# Altium schematic symbol library FPGA_Xilinx_Virtex6.SchLib: 28 symbols (part 3 of 21)
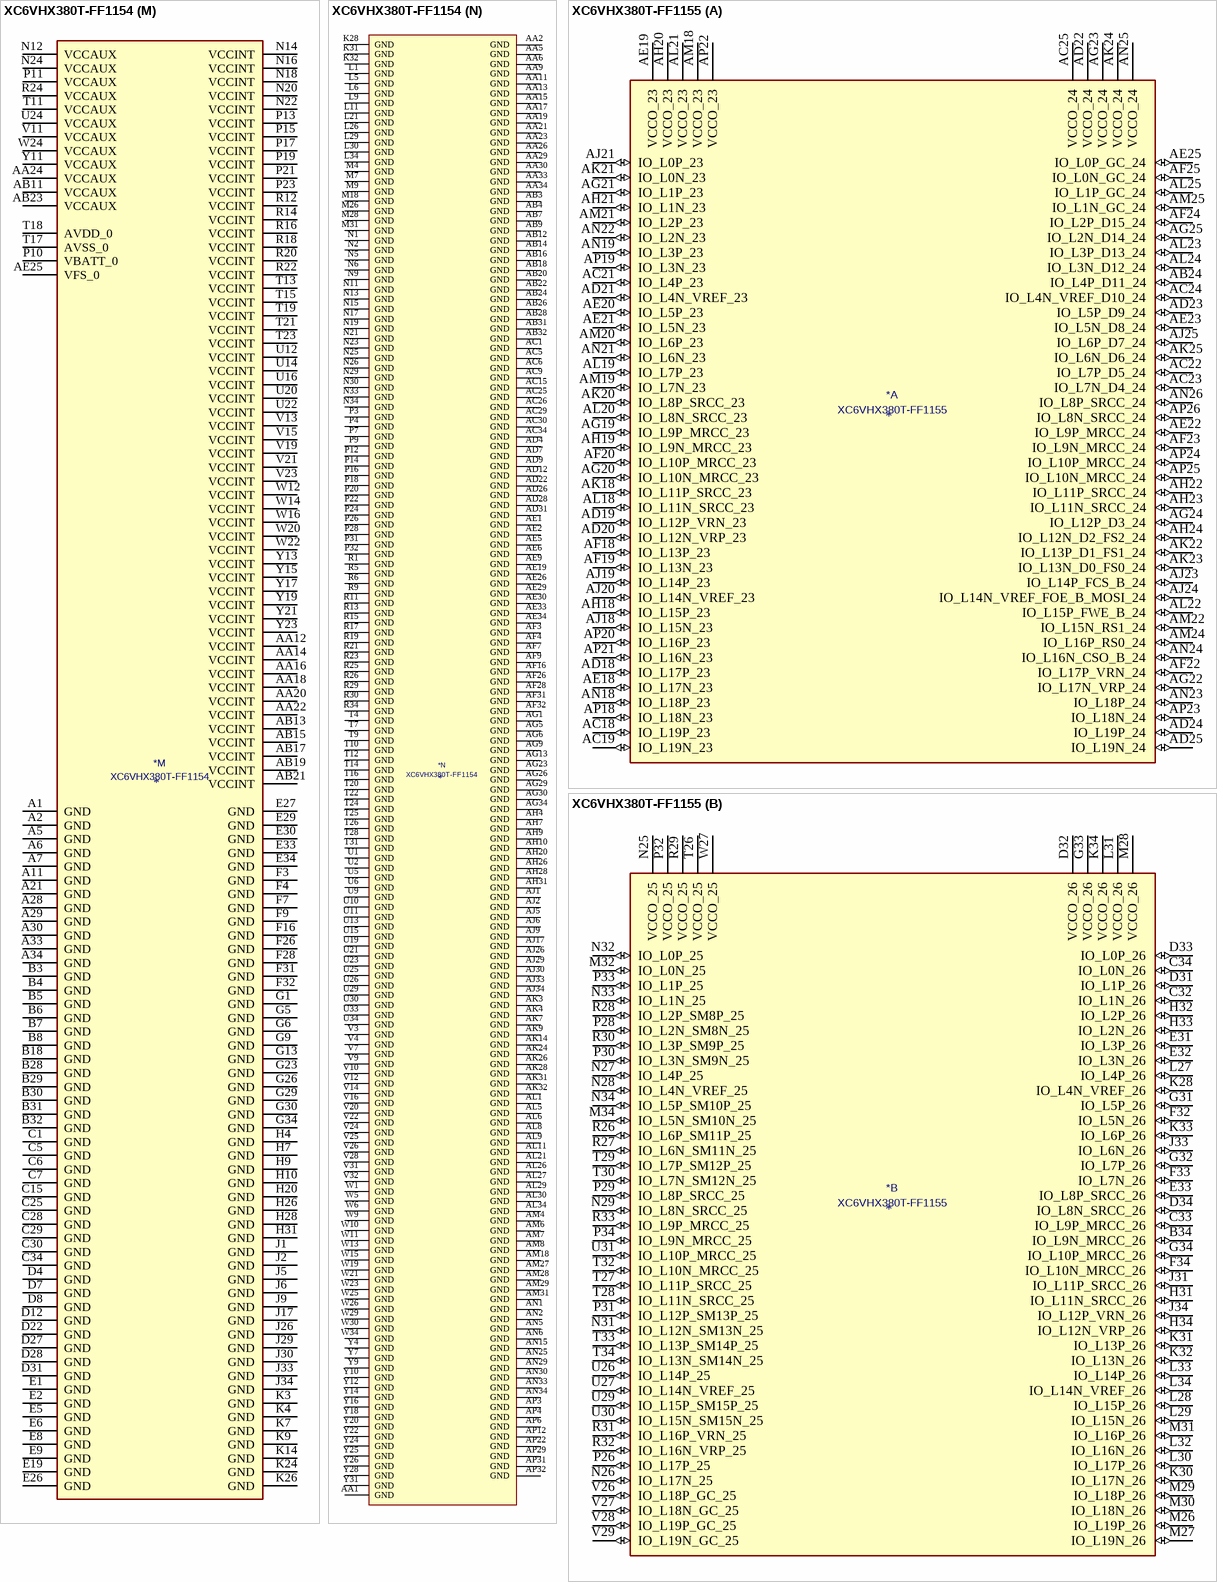
[diagram p103: symbols XC6VHX380T-FF1154 to XC6VHX380T-FF1155]

## XC6VHX380T-FF1154
designator *  value XC6VHX380T-FF1154
ki_keywords: FPGA; ki_description: Virtex 6 HXT 380 XC6VHX380T-FF1154
part A pins: AC18 IO_L4P_22 (io), AC19 IO_L4N_VREF_22 (io), AC20 VCCO_22 (power), AC21 IO_L18P_23 (io), AC22 IO_L18N_23 (io), AC23 IO_L1P_23 (io), AD18 IO_L17P_22 (io), AD19 IO_L17N_22 (io), AD20 IO_L9P_MRCC_22 (io), AD21 IO_L17P_23 (io), AD23 IO_L3P_23 (io), AD24 IO_L1N_23 (io), AE18 IO_L15P_22 (io), AE20 IO_L9N_MRCC_22 (io), AE21 IO_L17N_23 (io), AE22 IO_L9P_MRCC_23 (io), AE23 IO_L3N_23 (io), AE24 VCCO_23 (power), AF18 IO_L15N_22 (io), AF19 IO_L7P_22 (io), AF20 IO_L14P_22 (io), AF21 VCCO_23 (power), AF22 IO_L9N_MRCC_23 (io), AF23 IO_L16P_23 (io), AF24 IO_L16N_23 (io), AF25 IO_L6P_23 (io), AG18 VCCO_22 (power), AG19 IO_L7N_22 (io), AG20 IO_L14N_VREF_22 (io), AG21 IO_L8P_SRCC_22 (io), AG22 IO_L11P_SRCC_23 (io), AG24 IO_L14P_23 (io), AG25 IO_L6N_23 (io), AH18 IO_L13P_22 (io), AH19 IO_L5P_22 (io), AH21 IO_L8N_SRCC_22 (io), AH22 IO_L11N_SRCC_23 (io), AH23 IO_L5P_23 (io), AH24 IO_L14N_VREF_23 (io), AH25 VCCO_23 (power), AJ18 IO_L13N_22 (io), AJ19 IO_L5N_22 (io), AJ20 IO_L12P_VRN_22 (io), AJ21 IO_L6P_22 (io), AJ22 VCCO_22 (power), AJ23 IO_L5N_23 (io), AJ24 IO_L12P_VRN_23 (io), AJ25 IO_L12N_VRP_23 (io), AK18 IO_L11P_SRCC_22 (io), AK19 VCCO_22 (power), AK20 IO_L12N_VRP_22 (io), AK21 IO_L6N_22 (io), AK22 IO_L0P_22 (io), AK23 IO_L7P_23 (io), AK25 IO_L8P_SRCC_23 (io), AL18 IO_L11N_SRCC_22 (io), AL19 IO_L3P_22 (io), AL20 IO_L10P_MRCC_22 (io), AL22 IO_L0N_22 (io), AL23 IO_L7N_23 (io), AL24 IO_L10P_MRCC_23 (io), AL25 IO_L8N_SRCC_23 (io), AM19 IO_L3N_22 (io), AM20 IO_L10N_MRCC_22 (io), AM21 IO_L19P_22 (io), AM22 IO_L2P_22 (io), AM23 VCCO_23 (power), AM24 IO_L19P_23 (io), AM25 IO_L10N_MRCC_23 (io), AM26 IO_L4P_23 (io), AN18 IO_L1P_22 (io), AN19 IO_L18P_22 (io), AN20 VCCO_22 (power), AN21 IO_L19N_22 (io), AN22 IO_L2N_22 (io), AN23 IO_L15P_23 (io), AN24 IO_L19N_23 (io), AN26 IO_L2P_23 (io), AN27 IO_L4N_VREF_23 (io), AN28 IO_L0P_23 (io), AP18 IO_L1N_22 (io), AP19 IO_L18N_22 (io), AP20 IO_L16P_22 (io), AP21 IO_L16N_22 (io), AP23 IO_L15N_23 (io), AP24 IO_L13P_23 (io), AP25 IO_L13N_23 (io), AP26 IO_L2N_23 (io), AP27 VCCO_23 (power), AP28 IO_L0N_23 (io)
part B pins: A18 IO_L9P_MRCC_25 (io), A19 IO_L9N_MRCC_25 (io), A20 IO_L17N_25 (io), A22 IO_L18N_GC_25 (io), A23 IO_L17P_VRN_24 (io), A24 IO_L17N_VRP_24 (io), A25 IO_L4N_VREF_D10_24 (io), A26 VCCO_24 (power), A27 IO_L19N_24 (io), B19 IO_L17P_25 (io), B20 IO_L19P_GC_25 (io), B21 IO_L19N_GC_25 (io), B22 IO_L18P_GC_25 (io), B23 VCCO_25 (power), B24 IO_L4P_D11_24 (io), B25 IO_L2P_D15_24 (io), B26 IO_L2N_D14_24 (io), B27 IO_L19P_24 (io), C18 IO_L7N_SM12N_25 (io), C19 IO_L15N_SM15N_25 (io), C20 VCCO_25 (power), C21 IO_L14P_25 (io), C22 IO_L14N_VREF_25 (io), C23 IO_L5N_D8_24 (io), C24 IO_L15N_RS1_24 (io), C26 IO_L6P_D7_24 (io), C27 IO_L6N_D6_24 (io), D18 IO_L7P_SM12P_25 (io), D19 IO_L15P_SM15P_25 (io), D20 IO_L2N_SM8N_25 (io), D21 IO_L12N_SM13N_25 (io), D23 IO_L5P_D9_24 (io), D24 IO_L15P_FWE_B_24 (io), D25 IO_L8P_SRCC_24 (io), D26 IO_L8N_SRCC_24 (io), E18 IO_L5N_SM10N_25 (io), E20 IO_L2P_SM8P_25 (io), E21 IO_L12P_SM13P_25 (io), E22 IO_L16N_VRP_25 (io), E23 IO_L7N_D4_24 (io), E24 VCCO_24 (power), E25 IO_L10N_MRCC_24 (io), F18 IO_L5P_SM10P_25 (io), F19 IO_L13N_SM14N_25 (io), F20 IO_L0N_25 (io), F21 VCCO_25 (power), F22 IO_L16P_VRN_25 (io), F23 IO_L7P_D5_24 (io), F24 IO_L10P_MRCC_24 (io), F25 IO_L12N_D2_FS2_24 (io), G18 VCCO_25 (power), G19 IO_L13P_SM14P_25 (io), G20 IO_L0P_25 (io), G21 IO_L10N_MRCC_25 (io), G22 IO_L3N_D12_24 (io), G24 IO_L14N_VREF_FOE_B_MOSI_24 (io), G25 IO_L12P_D3_24 (io), H18 IO_L3N_SM9N_25 (io), H19 IO_L11N_SRCC_25 (io), H21 IO_L10P_MRCC_25 (io), H22 IO_L3P_D13_24 (io), H23 IO_L11N_SRCC_24 (io), H24 IO_L14P_FCS_B_24 (io), H25 VCCO_24 (power), J18 IO_L3P_SM9P_25 (io), J19 IO_L11P_SRCC_25 (io), J20 IO_L8N_SRCC_25 (io), J21 IO_L1N_GC_24 (io), J22 VCCO_24 (power), J23 IO_L11P_SRCC_24 (io), J24 IO_L16P_RS0_24 (io), J25 IO_L16N_CSO_B_24 (io), K18 IO_L1N_25 (io), K19 VCCO_25 (power), K20 IO_L8P_SRCC_25 (io), K21 IO_L1P_GC_24 (io), K22 IO_L9N_MRCC_24 (io), K23 IO_L13N_D0_FS0_24 (io), K25 IO_L18N_24 (io), L18 IO_L1P_25 (io), L19 IO_L4N_VREF_25 (io), L20 IO_L6N_SM11N_25 (io), L22 IO_L9P_MRCC_24 (io), L23 IO_L13P_D1_FS1_24 (io), L24 IO_L18P_24 (io), M19 IO_L4P_25 (io), M20 IO_L6P_SM11P_25 (io), M21 IO_L0P_GC_24 (io), M22 IO_L0N_GC_24 (io), M23 VCCO_24 (power)
part C pins: AC11 IO_L1N_33 (io), AC12 IO_L1P_33 (io), AC13 IO_L11P_SRCC_33 (io), AC14 IO_L17P_33 (io), AC16 IO_L9N_MRCC_32 (io), AC17 IO_L9P_MRCC_32 (io), AD11 IO_L0P_33 (io), AD13 IO_L11N_SRCC_33 (io), AD14 IO_L17N_33 (io), AD15 IO_L10P_MRCC_32 (io), AD16 IO_L13P_32 (io), AD17 VCCO_32 (power), AE11 IO_L0N_33 (io), AE12 IO_L2P_33 (io), AE13 IO_L13P_33 (io), AE14 VCCO_33 (power), AE15 IO_L10N_MRCC_32 (io), AE16 IO_L13N_32 (io), AE17 IO_L17P_32 (io), AF10 IO_L6P_33 (io), AF11 VCCO_33 (power), AF12 IO_L2N_33 (io), AF13 IO_L13N_33 (io), AF14 IO_L0P_32 (io), AF15 IO_L12P_VRN_32 (io), AF17 IO_L17N_32 (io), AG10 IO_L6N_33 (io), AG11 IO_L8P_SRCC_33 (io), AG12 IO_L3P_33 (io), AG14 IO_L0N_32 (io), AG15 IO_L12N_VRP_32 (io), AG16 IO_L7P_32 (io), AG17 IO_L15P_32 (io), AH11 IO_L8N_SRCC_33 (io), AH12 IO_L3N_33 (io), AH13 IO_L15P_33 (io), AH14 IO_L2P_32 (io), AH15 VCCO_32 (power), AH16 IO_L7N_32 (io), AH17 IO_L15N_32 (io), AJ10 IO_L10N_MRCC_33 (io), AJ11 IO_L10P_MRCC_33 (io), AJ12 VCCO_33 (power), AJ13 IO_L15N_33 (io), AJ14 IO_L2N_32 (io), AJ15 IO_L14P_32 (io), AJ16 IO_L5P_32 (io), AK10 IO_L12N_VRP_33 (io), AK11 IO_L12P_VRN_33 (io), AK12 IO_L5P_33 (io), AK13 IO_L6P_32 (io), AK15 IO_L14N_VREF_32 (io), AK16 IO_L5N_32 (io), AK17 IO_L11P_SRCC_32 (io), AL10 IO_L14P_33 (io), AL12 IO_L5N_33 (io), AL13 IO_L6N_32 (io), AL14 IO_L8N_SRCC_32 (io), AL15 IO_L8P_SRCC_32 (io), AL16 VCCO_32 (power), AL17 IO_L11N_SRCC_32 (io), AM9 IO_L16P_33 (io), AM10 IO_L14N_VREF_33 (io), AM11 IO_L19P_33 (io), AM12 IO_L7P_33 (io), AM13 VCCO_32 (power), AM14 IO_L16P_32 (io), AM15 IO_L4P_32 (io), AM16 IO_L3P_32 (io), AM17 IO_L19P_32 (io), AN7 IO_L4N_VREF_33 (io), AN8 IO_L4P_33 (io), AN9 IO_L16N_33 (io), AN10 VCCO_33 (power), AN11 IO_L19N_33 (io), AN12 IO_L7N_33 (io), AN13 IO_L16N_32 (io), AN14 IO_L4N_VREF_32 (io), AN16 IO_L3N_32 (io), AN17 IO_L19N_32 (io), AP7 VCCO_33 (power), AP8 IO_L18N_33 (io), AP9 IO_L18P_33 (io), AP10 IO_L9N_MRCC_33 (io), AP11 IO_L9P_MRCC_33 (io), AP13 IO_L18N_32 (io), AP14 IO_L18P_32 (io), AP15 IO_L1N_32 (io), AP16 IO_L1P_32 (io), AP17 VCCO_32 (power)
part D pins: A8 IO_L2N_A14_D30_34 (io), A9 IO_L2P_A15_D31_34 (io), A10 IO_L11N_SRCC_34 (io), A12 IO_L5N_A08_D24_34 (io), A13 IO_L18N_GC_35 (io), A14 IO_L18P_GC_35 (io), A15 IO_L2N_SM0N_35 (io), A16 VCCO_35 (power), A17 IO_L4N_VREF_35 (io), B9 IO_L6N_A06_D22_34 (io), B10 IO_L11P_SRCC_34 (io), B11 IO_L4N_VREF_A10_D26_34 (io), B12 IO_L5P_A09_D25_34 (io), B13 VCCO_34 (power), B14 IO_L19N_GC_35 (io), B15 IO_L2P_SM0P_35 (io), B16 IO_L7N_SM4N_35 (io), B17 IO_L4P_35 (io), C8 IO_L19N_VRP_34 (io), C9 IO_L6P_A07_D23_34 (io), C10 VCCO_34 (power), C11 IO_L13N_A00_D16_34 (io), C12 IO_L4P_A11_D27_34 (io), C13 IO_L14N_VREF_35 (io), C14 IO_L19P_GC_35 (io), C16 IO_L9N_MRCC_35 (io), C17 IO_L7P_SM4P_35 (io), D9 IO_L19P_VRN_34 (io), D10 IO_L0N_GC_34 (io), D11 IO_L13P_A01_D17_34 (io), D13 IO_L14P_35 (io), D14 IO_L8N_SRCC_35 (io), D15 IO_L17N_35 (io), D16 IO_L9P_MRCC_35 (io), D17 VCCO_35 (power), E10 IO_L8N_SRCC_34 (io), E11 IO_L0P_GC_34 (io), E12 IO_L15N_A22_34 (io), E13 IO_L16N_VRP_35 (io), E14 VCCO_35 (power), E15 IO_L8P_SRCC_35 (io), E16 IO_L17P_35 (io), E17 IO_L5N_SM2N_35 (io), F10 IO_L8P_SRCC_34 (io), F11 VCCO_34 (power), F12 IO_L15P_A23_34 (io), F13 IO_L16P_VRN_35 (io), F14 IO_L12N_SM5N_35 (io), F15 IO_L6N_SM3N_35 (io), F17 IO_L5P_SM2P_35 (io), G10 IO_L10N_MRCC_34 (io), G11 IO_L10P_MRCC_34 (io), G12 IO_L17N_A18_34 (io), G14 IO_L12P_SM5P_35 (io), G15 IO_L6P_SM3P_35 (io), G16 IO_L15N_SM7N_35 (io), G17 IO_L3N_SM1N_35 (io), H11 IO_L12N_A02_D18_34 (io), H12 IO_L17P_A19_34 (io), H13 IO_L9N_MRCC_34 (io), H14 IO_L3N_A12_D28_34 (io), H15 VCCO_35 (power), H16 IO_L15P_SM7P_35 (io), H17 IO_L3P_SM1P_35 (io), J10 IO_L18N_A16_34 (io), J11 IO_L12P_A03_D19_34 (io), J12 VCCO_34 (power), J13 IO_L9P_MRCC_34 (io), J14 IO_L3P_A13_D29_34 (io), J15 IO_L10N_MRCC_35 (io), J16 IO_L11N_SRCC_35 (io), K10 IO_L18P_A17_34 (io), K11 IO_L14N_VREF_A24_34 (io), K12 IO_L14P_A25_34 (io), K13 IO_L7N_A04_D20_34 (io), K15 IO_L10P_MRCC_35 (io), K16 IO_L11P_SRCC_35 (io), K17 IO_L1N_35 (io), L12 IO_L16N_A20_34 (io), L13 IO_L7P_A05_D21_34 (io), L14 IO_L1N_GC_34 (io), L15 IO_L13N_SM6N_35 (io), L16 VCCO_35 (power), L17 IO_L1P_35 (io), M12 IO_L16P_A21_34 (io), M13 VCCO_34 (power), M14 IO_L1P_GC_34 (io), M15 IO_L13P_SM6P_35 (io), M16 IO_L0N_35 (io), M17 IO_L0P_35 (io)
part E pins: AB29 MGTRXN3_101 (io), AB30 MGTRXP3_101 (io), AC27 MGTREFCLK1P_101 (io), AC28 MGTREFCLK1N_101 (io), AC31 MGTRXN2_101 (io), AC32 MGTRXP2_101 (io), AD29 MGTRXN1_101 (io), AD30 MGTRXP1_101 (io), AE27 MGTREFCLK0P_101 (io), AE28 MGTREFCLK0N_101 (io), AE31 MGTRXN0_101 (io), AE32 MGTRXP0_101 (io), AF29 MGTRXN3_100 (io), AF30 MGTRXP3_100 (io), AF33 MGTTXN3_101 (io), AF34 MGTTXP3_101 (io), AG27 MGTREFCLK1P_100 (io), AG28 MGTREFCLK1N_100 (io), AG31 MGTRXN2_100 (io), AG32 MGTRXP2_100 (io), AH29 MGTRXN1_100 (io), AH30 MGTRXP1_100 (io), AH33 MGTTXN2_101 (io), AH34 MGTTXP2_101 (io), AJ27 MGTREFCLK0P_100 (io), AJ28 MGTREFCLK0N_100 (io), AJ31 MGTTXN1_101 (io), AJ32 MGTTXP1_101 (io), AK29 MGTRXN0_100 (io), AK30 MGTRXP0_100 (io), AK33 MGTTXN0_101 (io), AK34 MGTTXP0_101 (io), AL31 MGTTXN3_100 (io), AL32 MGTTXP3_100 (io), AM33 MGTTXN2_100 (io), AM34 MGTTXP2_100 (io), AN31 MGTTXN1_100 (io), AN32 MGTTXP1_100 (io), AP33 MGTTXN0_100 (io), AP34 MGTTXP0_100 (io)
part F pins: AA27 MGTREFCLK0P_102 (io), AA28 MGTREFCLK0N_102 (io), AA31 MGTRXN0_102 (io), AA32 MGTRXP0_102 (io), AB33 MGTTXN1_102 (io), AB34 MGTTXP1_102 (io), AD33 MGTTXN0_102 (io), AD34 MGTTXP0_102 (io), K33 MGTTXN3_103 (io), K34 MGTTXP3_103 (io), M33 MGTTXN2_103 (io), M34 MGTTXP2_103 (io), P29 MGTRXN3_103 (io), P30 MGTRXP3_103 (io), P33 MGTTXN1_103 (io), P34 MGTTXP1_103 (io), R27 MGTREFCLK1P_103 (io), R28 MGTREFCLK1N_103 (io), R31 MGTRXN1_103 (io), R32 MGTRXP1_103 (io), T29 MGTRXN2_103 (io), T30 MGTRXP2_103 (io), T33 MGTTXN0_103 (io), T34 MGTTXP0_103 (io), U27 MGTREFCLK0P_103 (io), U28 MGTREFCLK0N_103 (io), U31 MGTRXN0_103 (io), U32 MGTRXP0_103 (io), V29 MGTRXN3_102 (io), V30 MGTRXP3_102 (io), V33 MGTTXN3_102 (io), V34 MGTTXP3_102 (io), W27 MGTREFCLK1P_102 (io), W28 MGTREFCLK1N_102 (io), W31 MGTRXN2_102 (io), W32 MGTRXP2_102 (io), Y29 MGTRXN1_102 (io), Y30 MGTRXP1_102 (io), Y33 MGTTXN2_102 (io), Y34 MGTTXP2_102 (io)
part G pins: A31 MGTTXN3_105 (io), A32 MGTTXP3_105 (io), B33 MGTTXN2_105 (io), B34 MGTTXP2_105 (io), C31 MGTTXN1_105 (io), C32 MGTTXP1_105 (io), D29 MGTRXN3_105 (io), D30 MGTRXP3_105 (io), D33 MGTTXN0_105 (io), D34 MGTTXP0_105 (io), E31 MGTTXN3_104 (io), E32 MGTTXP3_104 (io), F29 MGTRXN2_105 (io), F30 MGTRXP2_105 (io), F33 MGTTXN2_104 (io), F34 MGTTXP2_104 (io), G27 MGTREFCLK1P_105 (io), G28 MGTREFCLK1N_105 (io), G31 MGTTXN1_104 (io), G32 MGTTXP1_104 (io), H29 MGTRXN1_105 (io), H30 MGTRXP1_105 (io), H33 MGTTXN0_104 (io), H34 MGTTXP0_104 (io), J27 MGTREFCLK0P_105 (io), J28 MGTREFCLK0N_105 (io), J31 MGTRXN0_105 (io), J32 MGTRXP0_105 (io), K29 MGTRXN3_104 (io), K30 MGTRXP3_104 (io), L27 MGTREFCLK1P_104 (io), L28 MGTREFCLK1N_104 (io), L31 MGTRXN2_104 (io), L32 MGTRXP2_104 (io), M29 MGTRXN1_104 (io), M30 MGTRXP1_104 (io), N27 MGTREFCLK0P_104 (io), N28 MGTREFCLK0N_104 (io), N31 MGTRXN0_104 (io), N32 MGTRXP0_104 (io)
part H pins: AB5 MGTRXP3_111 (io), AB6 MGTRXN3_111 (io), AC3 MGTRXP2_111 (io), AC4 MGTRXN2_111 (io), AC7 MGTREFCLK1N_111 (io), AC8 MGTREFCLK1P_111 (io), AD5 MGTRXP1_111 (io), AD6 MGTRXN1_111 (io), AE3 MGTRXP0_111 (io), AE4 MGTRXN0_111 (io), AE7 MGTREFCLK0N_111 (io), AE8 MGTREFCLK0P_111 (io), AF1 MGTTXP3_111 (io), AF2 MGTTXN3_111 (io), AF5 MGTRXP3_110 (io), AF6 MGTRXN3_110 (io), AG3 MGTRXP2_110 (io), AG4 MGTRXN2_110 (io), AG7 MGTREFCLK1N_110 (io), AG8 MGTREFCLK1P_110 (io), AH1 MGTTXP2_111 (io), AH2 MGTTXN2_111 (io), AH5 MGTRXP1_110 (io), AH6 MGTRXN1_110 (io), AJ3 MGTTXP1_111 (io), AJ4 MGTTXN1_111 (io), AJ7 MGTREFCLK0N_110 (io), AJ8 MGTREFCLK0P_110 (io), AK1 MGTTXP0_111 (io), AK2 MGTTXN0_111 (io), AK5 MGTRXP0_110 (io), AK6 MGTRXN0_110 (io), AL3 MGTTXP3_110 (io), AL4 MGTTXN3_110 (io), AM1 MGTTXP2_110 (io), AM2 MGTTXN2_110 (io), AN3 MGTTXP1_110 (io), AN4 MGTTXN1_110 (io), AP1 MGTTXP0_110 (io), AP2 MGTTXN0_110 (io)
part I pins: AA3 MGTRXP0_112 (io), AA4 MGTRXN0_112 (io), AA7 MGTREFCLK0N_112 (io), AA8 MGTREFCLK0P_112 (io), AB1 MGTTXP1_112 (io), AB2 MGTTXN1_112 (io), AD1 MGTTXP0_112 (io), AD2 MGTTXN0_112 (io), K1 MGTTXP3_113 (io), K2 MGTTXN3_113 (io), M1 MGTTXP2_113 (io), M2 MGTTXN2_113 (io), P1 MGTTXP1_113 (io), P2 MGTTXN1_113 (io), P5 MGTRXP3_113 (io), P6 MGTRXN3_113 (io), R3 MGTRXP1_113 (io), R4 MGTRXN1_113 (io), R7 MGTREFCLK1N_113 (io), R8 MGTREFCLK1P_113 (io), T1 MGTTXP0_113 (io), T2 MGTTXN0_113 (io), T5 MGTRXP2_113 (io), T6 MGTRXN2_113 (io), U3 MGTRXP0_113 (io), U4 MGTRXN0_113 (io), U7 MGTREFCLK0N_113 (io), U8 MGTREFCLK0P_113 (io), V1 MGTTXP3_112 (io), V2 MGTTXN3_112 (io), V5 MGTRXP3_112 (io), V6 MGTRXN3_112 (io), W3 MGTRXP2_112 (io), W4 MGTRXN2_112 (io), W7 MGTREFCLK1N_112 (io), W8 MGTREFCLK1P_112 (io), Y1 MGTTXP2_112 (io), Y2 MGTTXN2_112 (io), Y5 MGTRXP1_112 (io), Y6 MGTRXN1_112 (io)
part J pins: A3 MGTTXP3_115 (io), A4 MGTTXN3_115 (io), B1 MGTTXP2_115 (io), B2 MGTTXN2_115 (io), C3 MGTTXP1_115 (io), C4 MGTTXN1_115 (io), D1 MGTTXP0_115 (io), D2 MGTTXN0_115 (io), D5 MGTRXP3_115 (io), D6 MGTRXN3_115 (io), E3 MGTTXP3_114 (io), E4 MGTTXN3_114 (io), F1 MGTTXP2_114 (io), F2 MGTTXN2_114 (io), F5 MGTRXP2_115 (io), F6 MGTRXN2_115 (io), G3 MGTTXP1_114 (io), G4 MGTTXN1_114 (io), G7 MGTREFCLK1N_115 (io), G8 MGTREFCLK1P_115 (io), H1 MGTTXP0_114 (io), H2 MGTTXN0_114 (io), H5 MGTRXP1_115 (io), H6 MGTRXN1_115 (io), J3 MGTRXP0_115 (io), J4 MGTRXN0_115 (io), J7 MGTREFCLK0N_115 (io), J8 MGTREFCLK0P_115 (io), K5 MGTRXP3_114 (io), K6 MGTRXN3_114 (io), L3 MGTRXP2_114 (io), L4 MGTRXN2_114 (io), L7 MGTREFCLK1N_114 (io), L8 MGTREFCLK1P_114 (io), M5 MGTRXP1_114 (io), M6 MGTRXN1_114 (io), N3 MGTRXP0_114 (io), N4 MGTRXN0_114 (io), N7 MGTREFCLK0N_114 (io), N8 MGTREFCLK0P_114 (io)
part K pins: AB8 MGTAVCC_RS (power), AB27 MGTAVCC_LS (power), AC2 MGTAVTT_RS (power), AC33 MGTAVTT_LS (power), AD3 MGTAVTT_RS (power), AD8 MGTAVCC_RS (power), AD27 MGTAVCC_LS (power), AD32 MGTAVTT_LS (power), AF8 MGTAVCC_RS (power), AF27 MGTAVCC_LS (power), AG2 MGTAVTT_RS (power), AG33 MGTAVTT_LS (power), AH3 MGTAVTT_RS (power), AH8 MGTAVCC_RS (power), AH27 MGTAVCC_LS (power), AH32 MGTAVTT_LS (power), AK8 MGTAVCC_RS (power), AK27 MGTAVCC_LS (power), AL2 MGTAVTT_RS (power), AL7 MGTAVCC_RS (power), AL28 MGTAVCC_LS (power), AL33 MGTAVTT_LS (power), AM3 MGTAVTT_RS (power), AM5 MGTRREF_115 (power), AM30 MGTRREF_105 (power), AM32 MGTAVTT_LS (power), AP5 MGTAVTTRCAL_115 (power), AP30 MGTAVTTRCAL_105 (power), C2 MGTAVTT_RN (power), C33 MGTAVTT_LN (power), D3 MGTAVTT_RN (power), D32 MGTAVTT_LN (power), E7 MGTAVCC_RN (power), E28 MGTAVCC_LN (power), F8 MGTAVCC_RN (power), F27 MGTAVCC_LN (power), G2 MGTAVTT_RN (power), G33 MGTAVTT_LN (power), H3 MGTAVTT_RN (power), H8 MGTAVCC_RN (power), H27 MGTAVCC_LN (power), H32 MGTAVTT_LN (power), K8 MGTAVCC_RN (power), K27 MGTAVCC_LN (power), L2 MGTAVTT_RN (power), L33 MGTAVTT_LN (power), M3 MGTAVTT_RN (power), M8 MGTAVCC_RN (power), M27 MGTAVCC_LN (power), M32 MGTAVTT_LN (power), P8 MGTAVCC_RN (power), P27 MGTAVCC_LN (power), R2 MGTAVTT_RN (power), R33 MGTAVTT_LN (power), T3 MGTAVTT_RN (power), T8 MGTAVCC_RN (power), T27 MGTAVCC_LN (power), T32 MGTAVTT_LN (power), V8 MGTAVCC_RN (power), V27 MGTAVCC_LN (power), W2 MGTAVTT_RS (power), W33 MGTAVTT_LS (power), Y3 MGTAVTT_RS (power), Y8 MGTAVCC_RS (power), Y27 MGTAVCC_LS (power), Y32 MGTAVTT_LS (power)
part L pins: AA10 TDO_0 (io), AA25 RDWR_B_0 (io), AB10 TCK_0 (io), AB25 CSI_B_0 (io), AC10 VCCO_0 (power), AC24 CCLK_0 (io), AD10 TMS_0 (io), AD25 DOUT_BUSY_0 (io), AE10 TDI_0 (io), L10 INIT_B_0 (io), L25 M2_0 (io), M10 HSWAPEN_0 (io), M11 DONE_0 (io), M24 M1_0 (io), M25 M0_0 (io), N10 VCCO_0 (power), P25 PROGRAM_B_0 (io), R10 DIN_0 (io), U17 VREFN_0 (io), U18 VP_0 (io), V17 VN_0 (io), V18 VREFP_0 (io), W17 DXN_0 (io), W18 DXP_0 (io)
part M pins: A1 GND (power), A2 GND (power), A5 GND (power), A6 GND (power), A7 GND (power), A11 GND (power), A21 GND (power), A28 GND (power), A29 GND (power), A30 GND (power), A33 GND (power), A34 GND (power), AA12 VCCINT (power), AA14 VCCINT (power), AA16 VCCINT (power), AA18 VCCINT (power), AA20 VCCINT (power), AA22 VCCINT (power), AA24 VCCAUX (power), AB11 VCCAUX (power), AB13 VCCINT (power), AB15 VCCINT (power), AB17 VCCINT (power), AB19 VCCINT (power), AB21 VCCINT (power), AB23 VCCAUX (power), AE25 VFS_0 (power), B3 GND (power), B4 GND (power), B5 GND (power), B6 GND (power), B7 GND (power), B8 GND (power), B18 GND (power), B28 GND (power), B29 GND (power), B30 GND (power), B31 GND (power), B32 GND (power), C1 GND (power), C5 GND (power), C6 GND (power), C7 GND (power), C15 GND (power), C25 GND (power), C28 GND (power), C29 GND (power), C30 GND (power), C34 GND (power), D4 GND (power), D7 GND (power), D8 GND (power), D12 GND (power), D22 GND (power), D27 GND (power), D28 GND (power), D31 GND (power), E1 GND (power), E2 GND (power), E5 GND (power), E6 GND (power), E8 GND (power), E9 GND (power), E19 GND (power), E26 GND (power), E27 GND (power), E29 GND (power), E30 GND (power), E33 GND (power), E34 GND (power), F3 GND (power), F4 GND (power), F7 GND (power), F9 GND (power), F16 GND (power), F26 GND (power), F28 GND (power), F31 GND (power), F32 GND (power), G1 GND (power), G5 GND (power), G6 GND (power), G9 GND (power), G13 GND (power), G23 GND (power), G26 GND (power), G29 GND (power), G30 GND (power), G34 GND (power), H4 GND (power), H7 GND (power), H9 GND (power), H10 GND (power), H20 GND (power), H26 GND (power), H28 GND (power), H31 GND (power), J1 GND (power), J2 GND (power), J5 GND (power), J6 GND (power), J9 GND (power), J17 GND (power), J26 GND (power), J29 GND (power), J30 GND (power), J33 GND (power), J34 GND (power), K3 GND (power), K4 GND (power), K7 GND (power), K9 GND (power), K14 GND (power), K24 GND (power), K26 GND (power), N12 VCCAUX (power), N14 VCCINT (power), N16 VCCINT (power), N18 VCCINT (power), N20 VCCINT (power), N22 VCCINT (power), N24 VCCAUX (power), P10 VBATT_0 (power), P11 VCCAUX (power), P13 VCCINT (power), P15 VCCINT (power), P17 VCCINT (power), P19 VCCINT (power), P21 VCCINT (power), P23 VCCINT (power), R12 VCCINT (power), R14 VCCINT (power), R16 VCCINT (power), R18 VCCINT (power), R20 VCCINT (power), R22 VCCINT (power), R24 VCCAUX (power), T11 VCCAUX (power), T13 VCCINT (power), T15 VCCINT (power), T17 AVSS_0 (power), T18 AVDD_0 (power), T19 VCCINT (power), T21 VCCINT (power), T23 VCCINT (power), U12 VCCINT (power), U14 VCCINT (power), U16 VCCINT (power), U20 VCCINT (power), U22 VCCINT (power), U24 VCCAUX (power), V11 VCCAUX (power), V13 VCCINT (power), V15 VCCINT (power), V19 VCCINT (power), V21 VCCINT (power), V23 VCCINT (power), W12 VCCINT (power), W14 VCCINT (power), W16 VCCINT (power), W20 VCCINT (power), W22 VCCINT (power), W24 VCCAUX (power), Y11 VCCAUX (power), Y13 VCCINT (power), Y15 VCCINT (power), Y17 VCCINT (power), Y19 VCCINT (power), Y21 VCCINT (power), Y23 VCCINT (power)
part N pins: AA1 GND (power), AA2 GND (power), AA5 GND (power), AA6 GND (power), AA9 GND (power), AA11 GND (power), AA13 GND (power), AA15 GND (power), AA17 GND (power), AA19 GND (power), AA21 GND (power), AA23 GND (power), AA26 GND (power), AA29 GND (power), AA30 GND (power), AA33 GND (power), AA34 GND (power), AB3 GND (power), AB4 GND (power), AB7 GND (power), AB9 GND (power), AB12 GND (power), AB14 GND (power), AB16 GND (power), AB18 GND (power), AB20 GND (power), AB22 GND (power), AB24 GND (power), AB26 GND (power), AB28 GND (power), AB31 GND (power), AB32 GND (power), AC1 GND (power), AC5 GND (power), AC6 GND (power), AC9 GND (power), AC15 GND (power), AC25 GND (power), AC26 GND (power), AC29 GND (power), AC30 GND (power), AC34 GND (power), AD4 GND (power), AD7 GND (power), AD9 GND (power), AD12 GND (power), AD22 GND (power), AD26 GND (power), AD28 GND (power), AD31 GND (power), AE1 GND (power), AE2 GND (power), AE5 GND (power), AE6 GND (power), AE9 GND (power), AE19 GND (power), AE26 GND (power), AE29 GND (power), AE30 GND (power), AE33 GND (power), AE34 GND (power), AF3 GND (power), AF4 GND (power), AF7 GND (power), AF9 GND (power), AF16 GND (power), AF26 GND (power), AF28 GND (power), AF31 GND (power), AF32 GND (power), AG1 GND (power), AG5 GND (power), AG6 GND (power), AG9 GND (power), AG13 GND (power), AG23 GND (power), AG26 GND (power), AG29 GND (power), AG30 GND (power), AG34 GND (power), AH4 GND (power), AH7 GND (power), AH9 GND (power), AH10 GND (power), AH20 GND (power), AH26 GND (power), AH28 GND (power), AH31 GND (power), AJ1 GND (power), AJ2 GND (power), AJ5 GND (power), AJ6 GND (power), AJ9 GND (power), AJ17 GND (power), AJ26 GND (power), AJ29 GND (power), AJ30 GND (power), AJ33 GND (power), AJ34 GND (power), AK3 GND (power), AK4 GND (power), AK7 GND (power), AK9 GND (power), AK14 GND (power), AK24 GND (power), AK26 GND (power), AK28 GND (power), AK31 GND (power), AK32 GND (power), AL1 GND (power), AL5 GND (power), AL6 GND (power), AL8 GND (power), AL9 GND (power), AL11 GND (power), AL21 GND (power), AL26 GND (power), AL27 GND (power), AL29 GND (power), AL30 GND (power), AL34 GND (power), AM4 GND (power), AM6 GND (power), AM7 GND (power), AM8 GND (power), AM18 GND (power), AM27 GND (power), AM28 GND (power), AM29 GND (power), AM31 GND (power), AN1 GND (power), AN2 GND (power), AN5 GND (power), AN6 GND (power), AN15 GND (power), AN25 GND (power), AN29 GND (power), AN30 GND (power), AN33 GND (power), AN34 GND (power), AP3 GND (power), AP4 GND (power), AP6 GND (power), AP12 GND (power), AP22 GND (power), AP29 GND (power), AP31 GND (power), AP32 GND (power), K28 GND (power), K31 GND (power), K32 GND (power), L1 GND (power), L5 GND (power), L6 GND (power), L9 GND (power), L11 GND (power), L21 GND (power), L26 GND (power), L29 GND (power), L30 GND (power), L34 GND (power), M4 GND (power), M7 GND (power), M9 GND (power), M18 GND (power), M26 GND (power), M28 GND (power), M31 GND (power), N1 GND (power), N2 GND (power), N5 GND (power), N6 GND (power), N9 GND (power), N11 GND (power), N13 GND (power), N15 GND (power), N17 GND (power), N19 GND (power), N21 GND (power), N23 GND (power), N25 GND (power), N26 GND (power), N29 GND (power), N30 GND (power), N33 GND (power), N34 GND (power), P3 GND (power), P4 GND (power), P7 GND (power), P9 GND (power), P12 GND (power), P14 GND (power), P16 GND (power), P18 GND (power), P20 GND (power), P22 GND (power), P24 GND (power), P26 GND (power), P28 GND (power), P31 GND (power), P32 GND (power), R1 GND (power), R5 GND (power), R6 GND (power), R9 GND (power), R11 GND (power), R13 GND (power), R15 GND (power), R17 GND (power), R19 GND (power), R21 GND (power), R23 GND (power), R25 GND (power), R26 GND (power), R29 GND (power), R30 GND (power), R34 GND (power), T4 GND (power), T7 GND (power), T9 GND (power), T10 GND (power), T12 GND (power), T14 GND (power), T16 GND (power), T20 GND (power), T22 GND (power), T24 GND (power), T25 GND (power), T26 GND (power), T28 GND (power), T31 GND (power), U1 GND (power), U2 GND (power), U5 GND (power), U6 GND (power), U9 GND (power), U10 GND (power), U11 GND (power), U13 GND (power), U15 GND (power), U19 GND (power), U21 GND (power), U23 GND (power), U25 GND (power), U26 GND (power), U29 GND (power), U30 GND (power), U33 GND (power), U34 GND (power), V3 GND (power), V4 GND (power), V7 GND (power), V9 GND (power), V10 GND (power), V12 GND (power), V14 GND (power), V16 GND (power), V20 GND (power), V22 GND (power), V24 GND (power), V25 GND (power), V26 GND (power), V28 GND (power), V31 GND (power), V32 GND (power), W1 GND (power), W5 GND (power), W6 GND (power), W9 GND (power), W10 GND (power), W11 GND (power), W13 GND (power), W15 GND (power), W19 GND (power), W21 GND (power), W23 GND (power), W25 GND (power), W26 GND (power), W29 GND (power), W30 GND (power), W34 GND (power), Y4 GND (power), Y7 GND (power), Y9 GND (power), Y10 GND (power), Y12 GND (power), Y14 GND (power), Y16 GND (power), Y18 GND (power), Y20 GND (power), Y22 GND (power), Y24 GND (power), Y25 GND (power), Y26 GND (power), Y28 GND (power), Y31 GND (power)

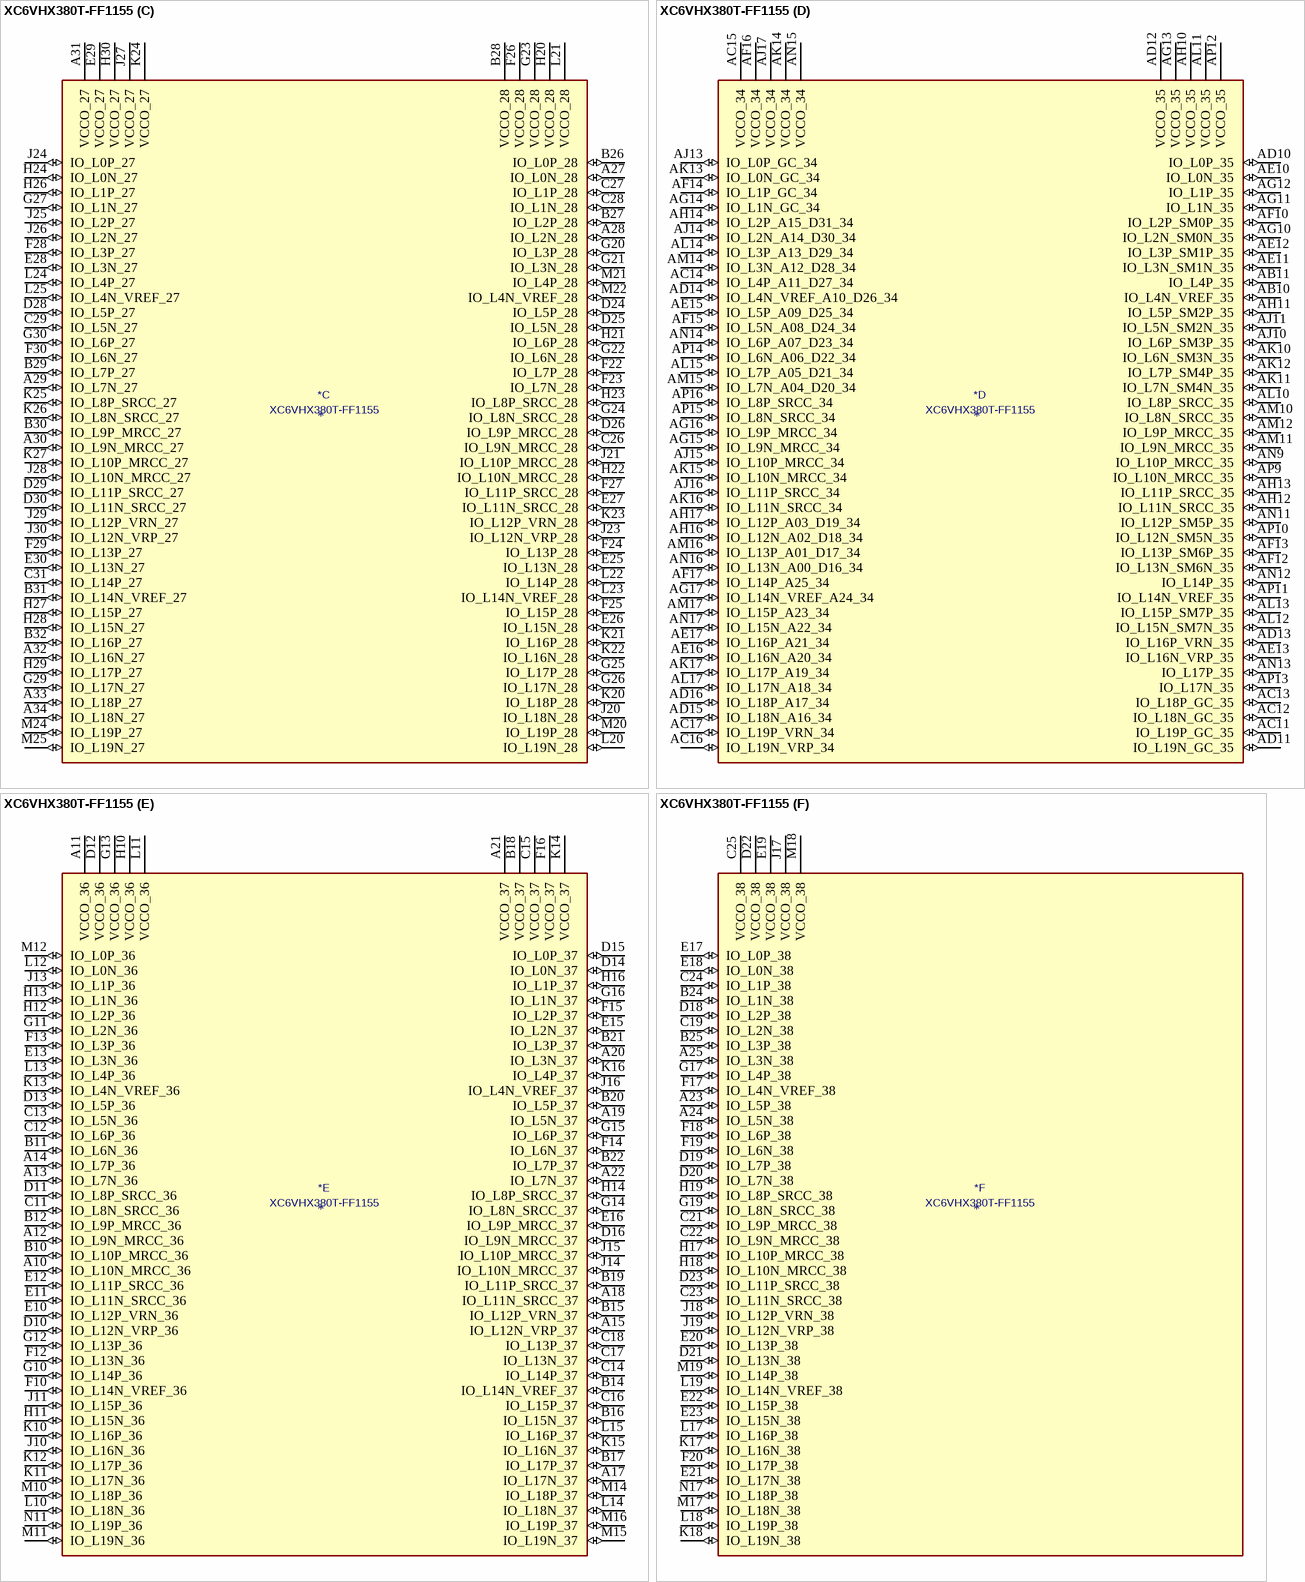
[diagram p13: symbol XC6VHX380T-FF1155]

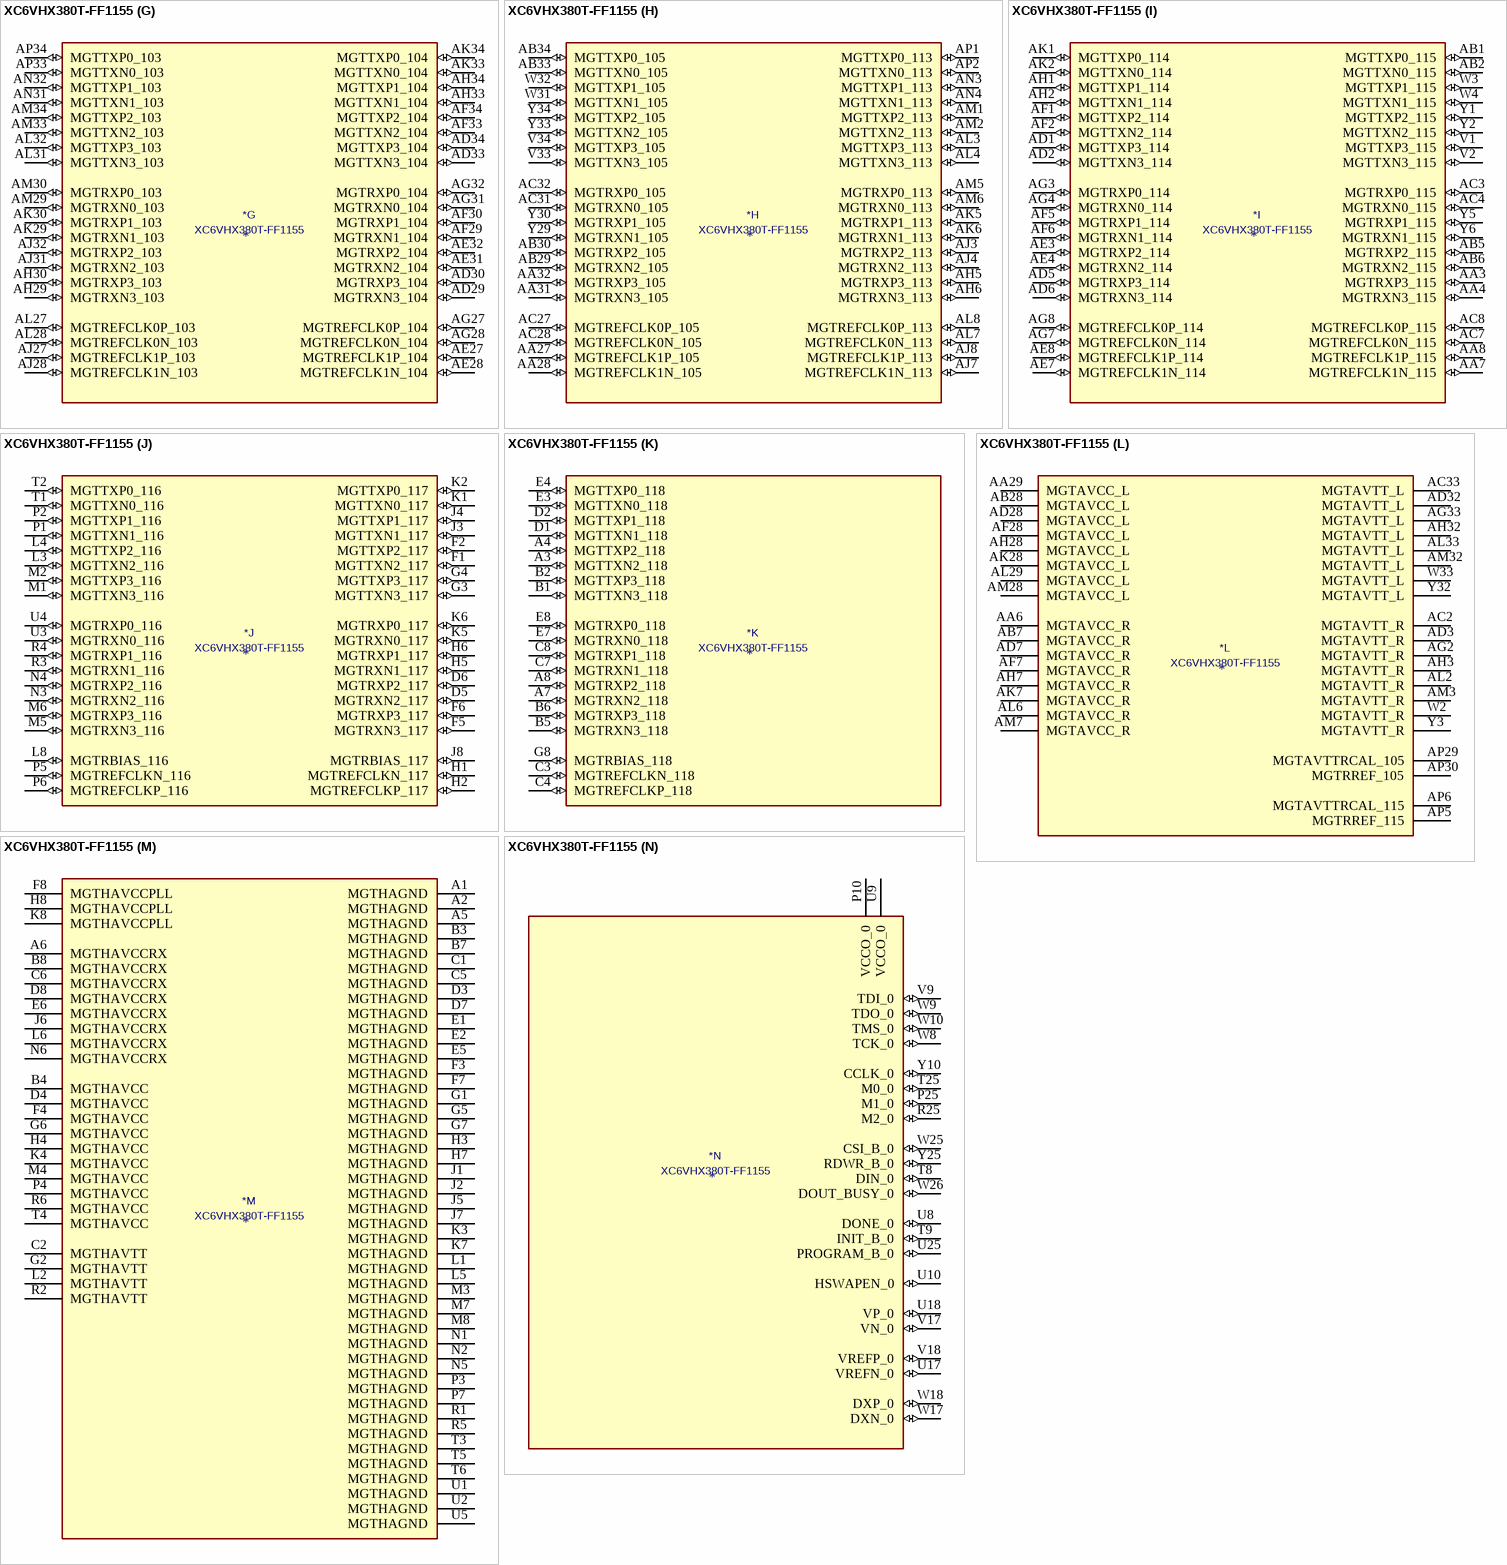
[diagram p14: symbol XC6VHX380T-FF1155]

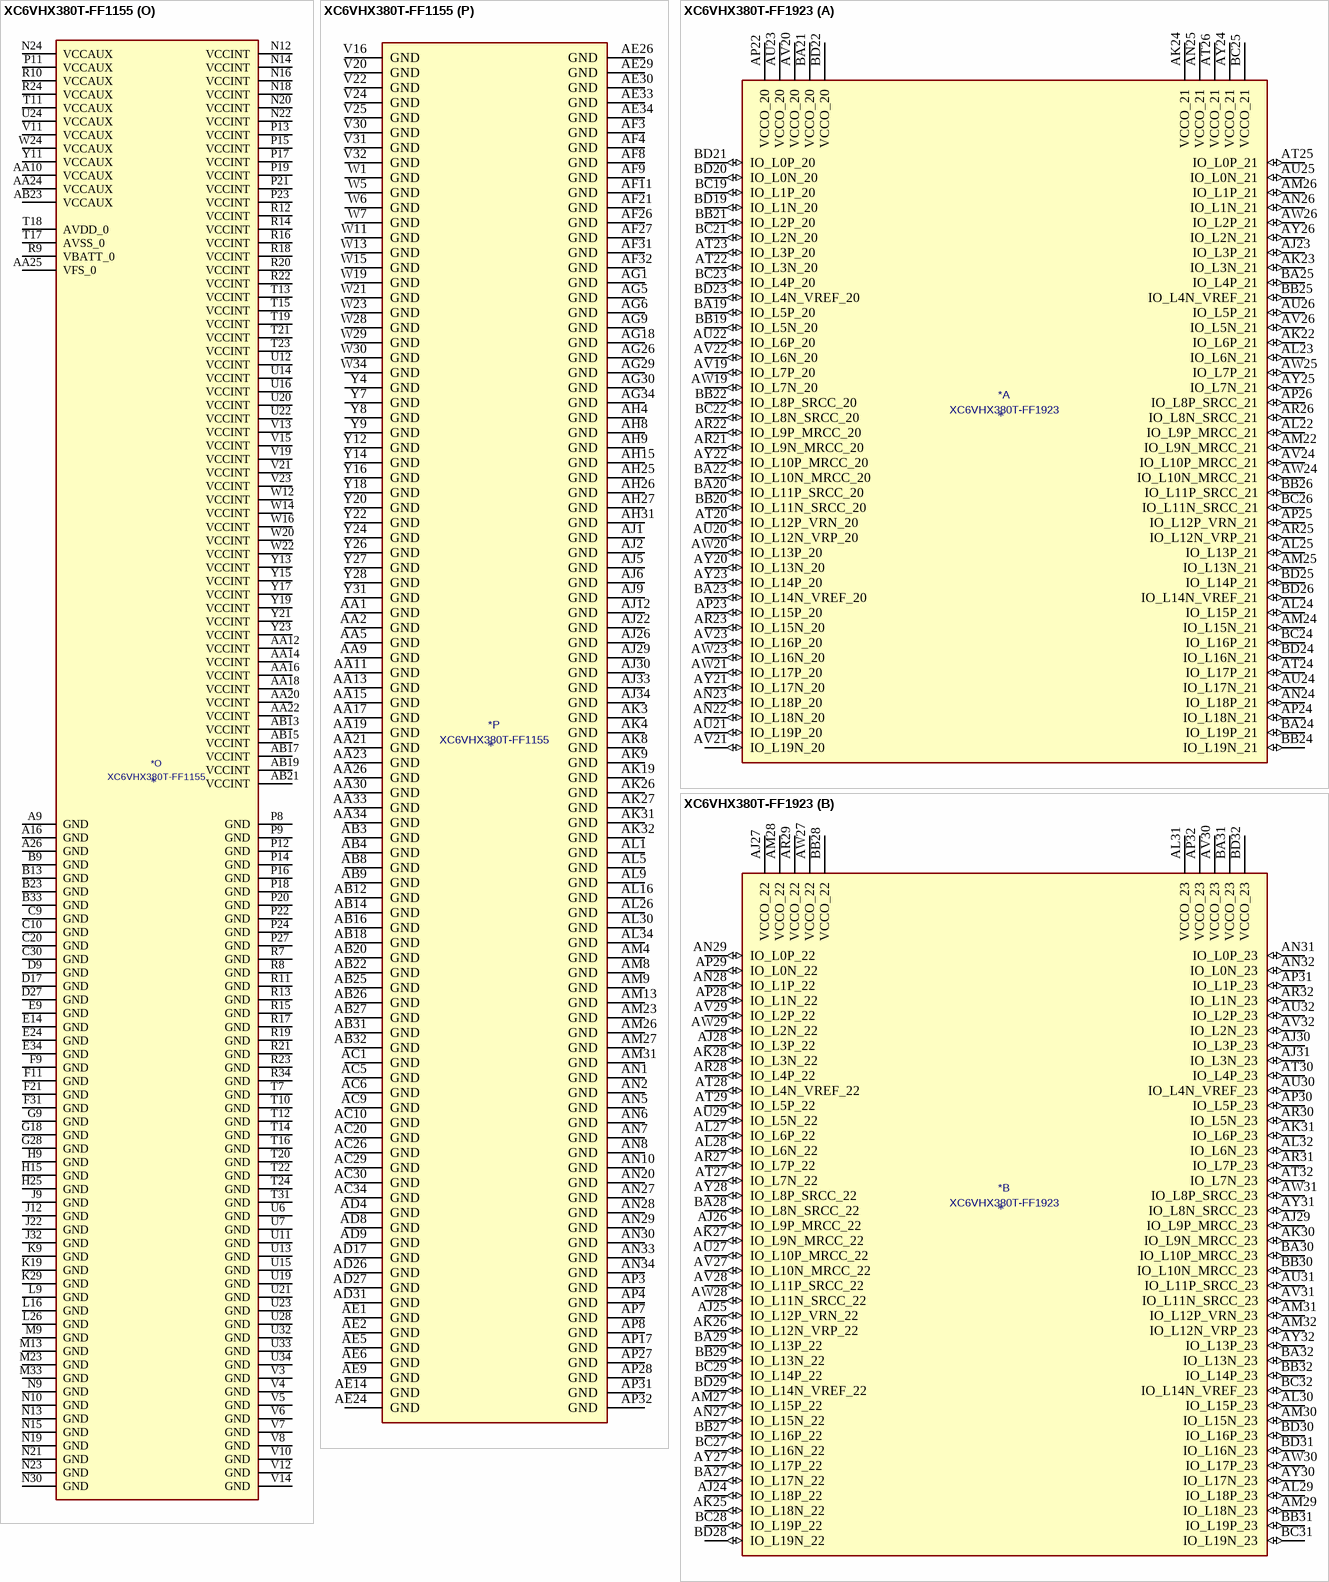
[diagram p15: symbols XC6VHX380T-FF1155 to XC6VHX380T-FF1923]
